# Altium footprint library 接插件.PcbLib: 88 footprints (part 3 of 6)
Each footprint in its own frame and in the unit in brackets; x right, y up, seen from the top. Pads: shape width x height; smd on the part's side, far side on the other; paste and mask are expansions set on the pad; w line width, h text height; cw(c..) or ccw(c..) is an arc to the next point about the centre after c.
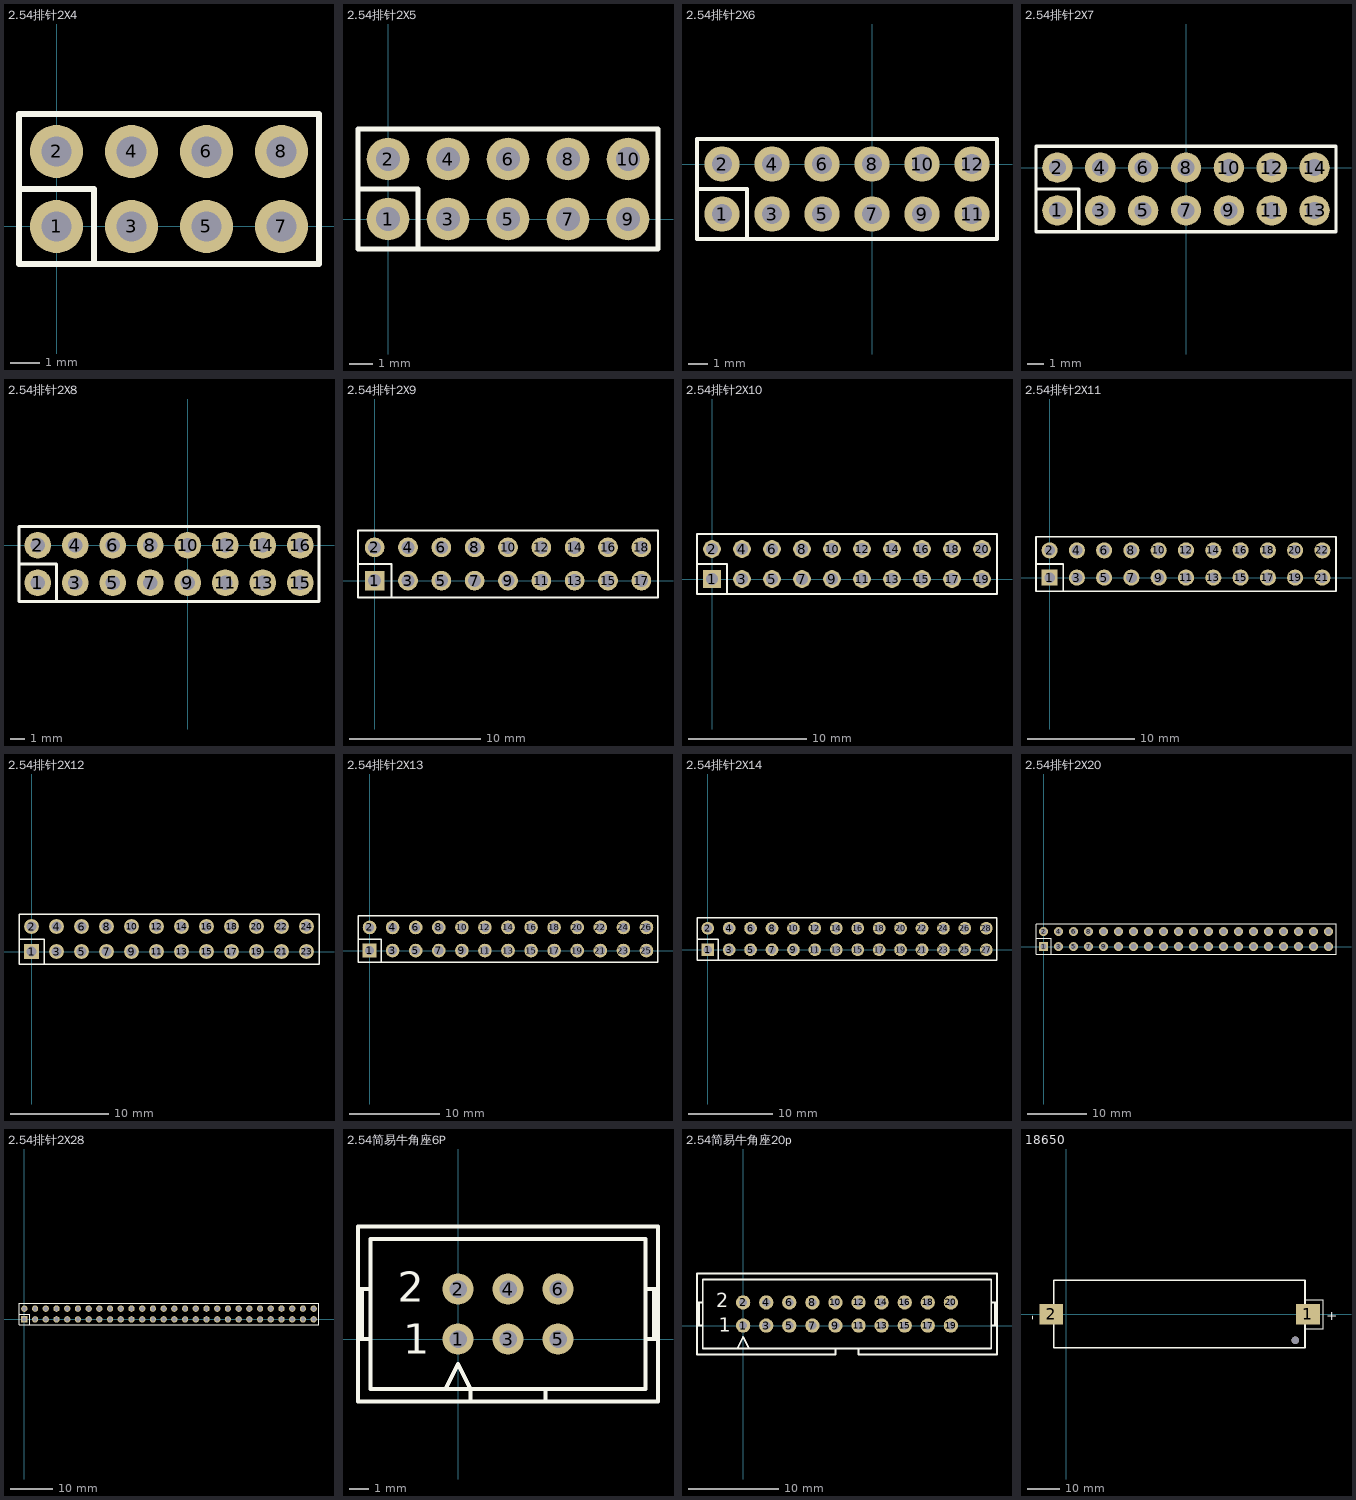
[diagram p2: the footprints below, top view; thin cyan lines are the x and y axes]

## 2.54排针2X4 [mm]
pads (8):
  round 1.8 hole 1: 1(0,0) 2(0,2.54) 3(2.54,0) 4(2.54,2.54) 5(5.08,0) 6(5.08,2.54) 7(7.62,0) 8(7.62,2.54)
Top Overlay:
  lines w0.2: -1.27,1.27 1.27,1.27 1.27,-1.27 ; -1.27,-1.27 -1.27,3.81 8.89,3.81 8.89,-1.27 -1.27,-1.27
3D body "1001-4.STEP": height 2.5, standoff -9.04, extent -1.27,-1.27 8.89,1.27
3D body "1001-4.STEP": height 2.5, standoff -9.04, extent -1.27,1.27 8.89,3.81

## 2.54排针2X5 [mm]
pads (10):
  round 1.8 hole 1: 1(0,0) 2(0,2.54) 3(2.54,0) 4(2.54,2.54) 5(5.08,0) 6(5.08,2.54) 7(7.62,0) 8(7.62,2.54) 9(10.16,0) 10(10.16,2.54)
Top Overlay:
  lines w0.2: -1.27,1.27 1.27,1.27 1.27,-1.016 1.27,-1.27 ; -1.27,-1.27 -1.27,3.81 11.43,3.81 11.43,-1.27 -1.27,-1.27
3D body "1001-5.STEP": height 2.5, standoff -9.04, extent -1.27,-1.27 11.43,1.27
3D body "1001-5.STEP": height 2.5, standoff -9.04, extent -1.27,1.27 11.43,3.81

## 2.54排针2X6 [mm]
pads (12):
  round 1.8 hole 1: 1(-7.62,-2.54) 2(-7.62,0) 3(-5.08,-2.54) 4(-5.08,0) 5(-2.54,-2.54) 6(-2.54,0) 7(0,-2.54) 8(0,0) 9(2.54,-2.54) 10(2.54,0) 11(5.08,-2.54) 12(5.08,0)
Top Overlay:
  lines w0.2: -8.89,-1.27 -6.35,-1.27 -6.35,-3.81 ; -8.89,-3.81 6.35,-3.81 6.35,1.27 -8.89,1.27 -8.89,-3.81
3D body "1001-6.STEP": height 2.5, standoff -9.04, extent -8.89,-1.27 6.35,1.27
3D body "1001-6.STEP": height 2.5, standoff -9.04, extent -8.89,-3.81 6.35,-1.27

## 2.54排针2X7 [mm]
pads (14):
  round 1.8 hole 1: 1(-7.62,-2.54) 2(-7.62,0) 3(-5.08,-2.54) 4(-5.08,0) 5(-2.54,-2.54) 6(-2.54,0) 7(0,-2.54) 8(0,0) 9(2.54,-2.54) 10(2.54,0) 11(5.08,-2.54) 12(5.08,0) 13(7.62,-2.54) 14(7.62,0)
Top Overlay:
  lines w0.2: -8.89,-1.27 -6.35,-1.27 -6.35,-3.81 -3.81,-3.81 ; -3.81,1.27 -1.27,1.27 ; -1.27,-3.81 1.27,-3.81 3.81,-3.81 ; -8.89,-3.81 8.89,-3.81 8.89,1.27 -8.89,1.27 -8.89,-3.81
3D body "1001-7.STEP": height 2.5, standoff -9.04, extent -8.89,-1.27 8.89,1.27
3D body "1001-7.STEP": height 2.5, standoff -9.04, extent -8.89,-3.81 8.89,-1.27

## 2.54排针2X8 [mm]
pads (16):
  round 1.8 hole 1: 1(-10.16,-2.54) 2(-10.16,0) 3(-7.62,-2.54) 4(-7.62,0) 5(-5.08,-2.54) 6(-5.08,0) 7(-2.54,-2.54) 8(-2.54,0) 9(0,-2.54) 10(0,0) 11(2.54,-2.54) 12(2.54,0) 13(5.08,-2.54) 14(5.08,0) 15(7.62,-2.54) 16(7.62,0)
Top Overlay:
  lines w0.2: -11.43,-1.27 -8.89,-1.27 -8.89,-3.81 ; -11.43,-3.81 -11.43,1.27 8.89,1.27 8.89,-3.81 -11.43,-3.81
3D body "1001-8.STEP": height 2.5, standoff -9.04, extent -11.43,-3.81 8.89,-1.27
3D body "1001-8.STEP": height 2.5, standoff -9.04, extent -11.43,-1.27 8.89,1.27

## 2.54排针2X9 [mm]
pads (18):
  rect 1.5x1.5 hole 1: 1(0,0)
  round 1.5 hole 1: 2(0,2.54) 3(2.54,0) 4(2.54,2.54) 5(5.08,0) 6(5.08,2.54) 7(7.62,0) 8(7.62,2.54) 9(10.16,0) 10(10.16,2.54) 11(12.7,0) 12(12.7,2.54) 13(15.24,0) 14(15.24,2.54) 15(17.78,0) 16(17.78,2.54) 17(20.32,0) 18(20.32,2.54)
Top Overlay:
  lines w0.15: -1.27,1.27 1.27,1.27 1.27,-1.27 ; -1.27,-1.27 -1.27,3.81 21.59,3.81 21.59,-1.27 -1.27,-1.27
3D body "User Library-PLD-xx.step": height 8.4, standoff -3, extent -1.27,-1.23 21.59,3.77

## 2.54排针2X10 [mm]
pads (20):
  rect 1.5x1.5 hole 1: 1(0,0)
  round 1.5 hole 1: 2(0,2.54) 3(2.54,0) 4(2.54,2.54) 5(5.08,0) 6(5.08,2.54) 7(7.62,0) 8(7.62,2.54) 9(10.16,0) 10(10.16,2.54) 11(12.7,0) 12(12.7,2.54) 13(15.24,0) 14(15.24,2.54) 15(17.78,0) 16(17.78,2.54) 17(20.32,0) 18(20.32,2.54) 19(22.86,0) 20(22.86,2.54)
Top Overlay:
  lines w0.15: -1.27,1.27 1.27,1.27 1.27,-1.27 ; -1.27,-1.27 -1.27,3.81 24.13,3.81 24.13,-1.27 -1.27,-1.27
3D body "User Library-PLD-xx.step": height 8.4, standoff -3, extent -1.27,-1.23 24.13,3.77

## 2.54排针2X11 [mm]
pads (22):
  rect 1.5x1.5 hole 1: 1(0,0)
  round 1.5 hole 1: 2(0,2.54) 3(2.54,0) 4(2.54,2.54) 5(5.08,0) 6(5.08,2.54) 7(7.62,0) 8(7.62,2.54) 9(10.16,0) 10(10.16,2.54) 11(12.7,0) 12(12.7,2.54) 13(15.24,0) 14(15.24,2.54) 15(17.78,0) 16(17.78,2.54) 17(20.32,0) 18(20.32,2.54) 19(22.86,0) 20(22.86,2.54) 21(25.4,0) 22(25.4,2.54)
Top Overlay:
  lines w0.15: -1.27,1.27 1.27,1.27 1.27,-1.27 ; -1.27,-1.27 26.67,-1.27 26.67,3.81 -1.27,3.81 -1.27,-1.27
3D body "User Library-PLD-22.step": height 8.4, standoff -3, extent -1.27,-1.23 26.67,3.77

## 2.54排针2X12 [mm]
pads (24):
  rect 1.5x1.5 hole 1: 1(0,0)
  round 1.5 hole 1: 2(0,2.54) 3(2.54,0) 4(2.54,2.54) 5(5.08,0) 6(5.08,2.54) 7(7.62,0) 8(7.62,2.54) 9(10.16,0) 10(10.16,2.54) 11(12.7,0) 12(12.7,2.54) 13(15.24,0) 14(15.24,2.54) 15(17.78,0) 16(17.78,2.54) 17(20.32,0) 18(20.32,2.54) 19(22.86,0) 20(22.86,2.54) 21(25.4,0) 22(25.4,2.54) 23(27.94,0) 24(27.94,2.54)
Top Overlay:
  lines w0.15: -1.27,1.27 1.27,1.27 1.27,-1.27 ; -1.27,-1.27 29.21,-1.27 29.21,3.81 -1.27,3.81 -1.27,-1.27
3D body "Samtec-24.step": height 8.89, standoff -1.27, extent -1.27,-1.27 29.21,3.81

## 2.54排针2X13 [mm]
pads (26):
  rect 1.5x1.5 hole 1: 1(0,0)
  round 1.5 hole 1: 2(0,2.54) 3(2.54,0) 4(2.54,2.54) 5(5.08,0) 6(5.08,2.54) 7(7.62,0) 8(7.62,2.54) 9(10.16,0) 10(10.16,2.54) 11(12.7,0) 12(12.7,2.54) 13(15.24,0) 14(15.24,2.54) 15(17.78,0) 16(17.78,2.54) 17(20.32,0) 18(20.32,2.54) 19(22.86,0) 20(22.86,2.54) 21(25.4,0) 22(25.4,2.54) 23(27.94,0) 24(27.94,2.54) 25(30.48,0) 26(30.48,2.54)
Top Overlay:
  lines w0.15: -1.27,1.27 1.27,1.27 1.27,-1.27 ; -1.27,-1.27 -1.27,3.81 31.75,3.81 31.75,-1.27 -1.27,-1.27
3D body "Samtec-13.step": height 8.89, standoff -1.27, extent -1.27,-1.27 31.75,3.81

## 2.54排针2X14 [mm]
pads (28):
  rect 1.5x1.5 hole 1: 1(0,0)
  round 1.5 hole 1: 2(0,2.54) 3(2.54,0) 4(2.54,2.54) 5(5.08,0) 6(5.08,2.54) 7(7.62,0) 8(7.62,2.54) 9(10.16,0) 10(10.16,2.54) 11(12.7,0) 12(12.7,2.54) 13(15.24,0) 14(15.24,2.54) 15(17.78,0) 16(17.78,2.54) 17(20.32,0) 18(20.32,2.54) 19(22.86,0) 20(22.86,2.54) 21(25.4,0) 22(25.4,2.54) 23(27.94,0) 24(27.94,2.54) 25(30.48,0) 26(30.48,2.54) 27(33.02,0) 28(33.02,2.54)
Top Overlay:
  lines w0.15: -1.27,1.27 1.27,1.27 1.27,-1.27 ; -1.27,-1.27 -1.27,3.81 34.29,3.81 34.29,-1.27 -1.27,-1.27
3D body "Samtec-14.step": height 8.89, standoff -1.27, extent -1.27,-1.27 34.29,3.81

## 2.54排针2X20 [mm]
pads (40):
  rect 1.5x1.5 hole 1: 1(0,0)
  round 1.5 hole 1: 2(0,2.54) 3(2.54,0) 4(2.54,2.54) 5(5.08,0) 6(5.08,2.54) 7(7.62,0) 8(7.62,2.54) 9(10.16,0) 10(10.16,2.54) 11(12.7,0) 12(12.7,2.54) 13(15.24,0) 14(15.24,2.54) 15(17.78,0) 16(17.78,2.54) 17(20.32,0) 18(20.32,2.54) 19(22.86,0) 20(22.86,2.54) 21(25.4,0) 22(25.4,2.54) 23(27.94,0) 24(27.94,2.54) 25(30.48,0) 26(30.48,2.54) 27(33.02,0) 28(33.02,2.54) 29(35.56,0) 30(35.56,2.54) 31(38.1,0) 32(38.1,2.54) 33(40.64,0) 34(40.64,2.54) 35(43.18,0) 36(43.18,2.54) 37(45.72,0) 38(45.72,2.54) 39(48.26,0) 40(48.26,2.54)
Top Overlay:
  lines w0.15: -1.27,3.81 -1.27,-1.298 49.53,-1.298 49.53,3.888 -1.27,3.888 ; -1.247,1.374 -1.247,-1.321 1.295,-1.321 1.295,1.397 -1.245,1.372
3D body "Samtec-40.step": height 8.89, standoff -1.27, extent -1.27,-1.284 49.53,3.796

## 2.54排针2X28 [mm]
pads (56):
  rect 1.5x1.5 hole 1: 1(0,0)
  round 1.5 hole 1: 2(0,2.54) 3(2.54,0) 4(2.54,2.54) 5(5.08,0) 6(5.08,2.54) 7(7.62,0) 8(7.62,2.54) 9(10.16,0) 10(10.16,2.54) 11(12.7,0) 12(12.7,2.54) 13(15.24,0) 14(15.24,2.54) 15(17.78,0) 16(17.78,2.54) 17(20.32,0) 18(20.32,2.54) 19(22.86,0) 20(22.86,2.54) 21(25.4,0) 22(25.4,2.54) 23(27.94,0) 24(27.94,2.54) 25(30.48,0) 26(30.48,2.54) 27(33.02,0) 28(33.02,2.54) 29(35.56,0) 30(35.56,2.54) 31(38.1,0) 32(38.1,2.54) 33(40.64,0) 34(40.64,2.54) 35(43.18,0) 36(43.18,2.54) 37(45.72,0) 38(45.72,2.54) 39(48.26,0) 40(48.26,2.54) 41(50.8,0) 42(50.8,2.54) 43(53.34,0) 44(53.34,2.54) 45(55.88,0) 46(55.88,2.54) 47(58.42,0) 48(58.42,2.54) 49(60.96,0) 50(60.96,2.54) 51(63.5,0) 52(63.5,2.54) 53(66.04,0) 54(66.04,2.54) 55(68.58,0) 56(68.58,2.54)
Top Overlay:
  lines w0.15: -1.27,1.27 1.27,1.27 1.27,-1.27 ; -1.27,-1.27 69.85,-1.27 69.85,3.81 -1.27,3.81 -1.27,-1.27
3D body "Samtec-hmtsw-28.step": height 8.89, standoff -1.27, extent -1.27,-1.27 69.85,3.81

## 2.54简易牛角座6P [mil]
pads (6):
  round 62 hole 35: 1(0,0) 2(0,100) 3(100,0) 4(100,100) 5(200,0) 6(200,100)
Top Overlay:
  lines w8: -200,0 -175,0 ; -200,100 -175,100 ; -191.67,0 -191.67,100 ; -25,-100 0,-50 25,-100 ; 25,-125 25,-100 ; 125,-100 -175,-100 -175,200 375,200 375,-100 175,-100 ; 175,-125 175,-100 ; 375,0 400,0 ; 375,100 400,100 ; 391.67,0 391.67,100 ; 25,-100 175,-100 ; -200,-125 -200,225 400,225 400,-125 -200,-125
  text "2" at -121,75 h60
  text "1" at -110,-29 h60
3D body "User Library-IDC Socket Male 6pin Straight THT Goldplated 2_54mm.step": height 359.45, standoff -128.74, extent -199.61,-117.32 399.61,231.1

## 2.54简易牛角座20p [mil]
pads (20):
  round 62 hole 35: 1(0,0) 2(0,100) 3(100,0) 4(100,100) 5(200,0) 6(200,100) 7(300,0) 8(300,100) 9(400,0) 10(400,100) 11(500,0) 12(500,100) 13(600,0) 14(600,100) 15(700,0) 16(700,100) 17(800,0) 18(800,100) 19(900,0) 20(900,100)
Top Overlay:
  lines w8: -200,0 -175,0 ; -200,100 -175,100 ; -191.67,0 -191.67,100 ; -25,-100 0,-50 25,-100 ; 400,-100 400,-125 -200,-125 -200,225 1100,225 1100,-125 500,-125 500,-100 ; 1075,0 1100,0 ; 1075,100 1100,100 ; 1091.67,0 1091.67,100 ; -175,-100 125,-100 275,-100 1075,-100 1075,200 -175,200 -175,-100
  text "1" at -106,-26 h60
  text "2" at -117,79 h60
3D body "User Library-BH-20.step": height 344.49, standoff -122.05, extent -195,-120 1105,238.27

## 18650 [mm] "单节电池座"
pads (2):
  rect 7.3x6.4 smd: 1(74.128,0) 2(-4.572,0)
via 70.231,-8.001 diameter 2.4 hole 2.4
Top Overlay:
  lines w0.3: 73.279,-4.445 78.867,-4.445 78.867,4.445 73.406,4.445
  lines w0.6: -3.821,-10.287 -3.821,10.413 73.279,10.413 73.279,-10.287 -3.821,-10.287
  text "+" at 79.756,-1.778 h3
  text "-" at -9.271,-1.778 h3